# Altium footprint library JL_PCB.PCBLIB: 1129 footprints (part 58 of 72)
Each footprint in its own frame and in the unit in brackets; x right, y up, seen from the top. Pads: shape width x height; smd on the part's side, far side on the other; paste and mask are expansions set on the pad; w line width, h text height; cw(c..) or ccw(c..) is an arc to the next point about the centre after c.
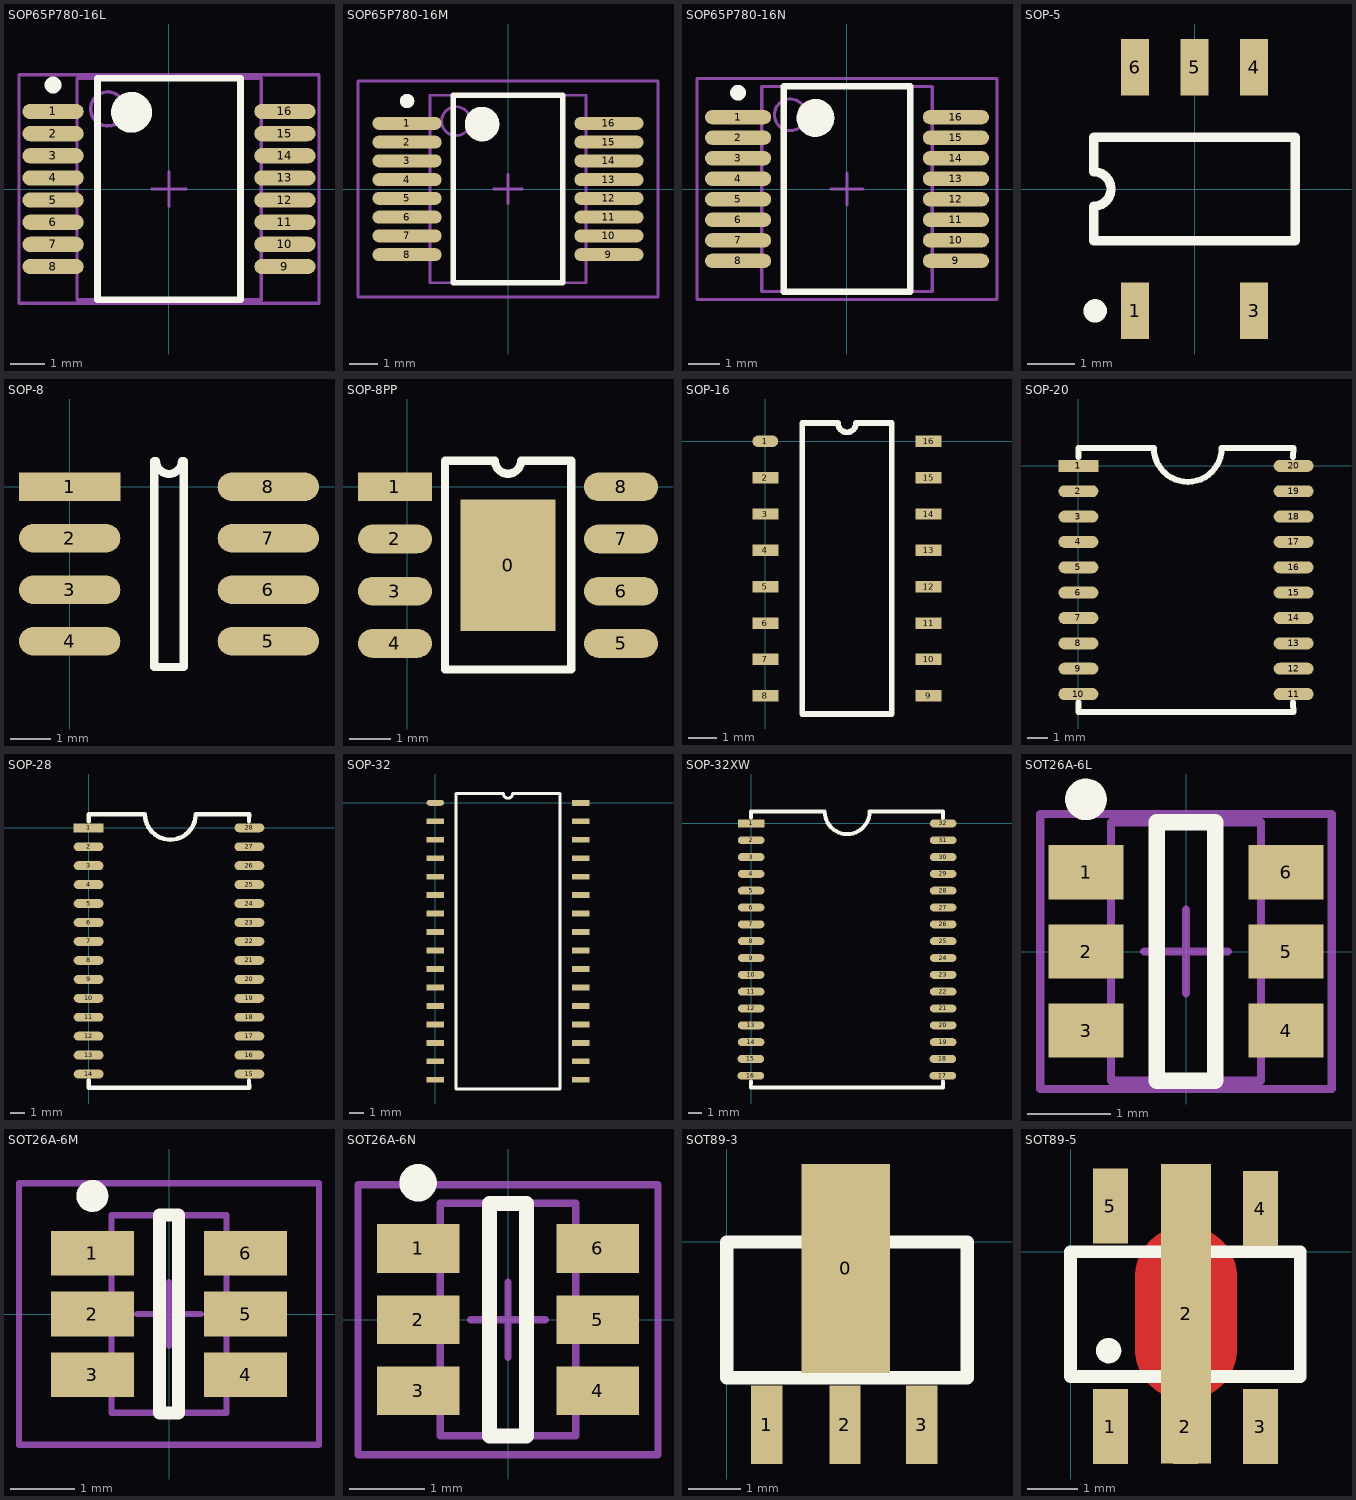
[diagram p57: the footprints below, top view; thin cyan lines are the x and y axes]

## SOP65P780-16L [mm] "SOP, 16-Leads, Body 6.2x5.3mm, Pitch 0.65mm, IPC High Density"
height 2
pads (16):
  oval 1.8x0.45 smd: 1(-3.4,2.275) 2(-3.4,1.625) 3(-3.4,0.975) 4(-3.4,0.325) 5(-3.4,-0.325) 6(-3.4,-0.975) 7(-3.4,-1.625) 8(-3.4,-2.275) 9(3.4,-2.275) 10(3.4,-1.625) 11(3.4,-0.975) 12(3.4,-0.325) 13(3.4,0.325) 14(3.4,0.975) 15(3.4,1.625) 16(3.4,2.275)
TopOverlay:
  circle w0.6: c-1.1,2.25 r0.3
  circle w0.25: c-3.4,3.05 r0.125
  lines w0.2: -2.1,-3.25 2.1,-3.25 2.1,3.25 -2.1,3.25 -2.1,-3.25
Mechanical13:
  circle w0.1: c-1.8,2.35 r0.5
  lines w0.1: -2.7,-3.25 2.7,-3.25 2.7,3.25 -2.7,3.25 -2.7,-3.25
Mechanical15:
  lines w0.1: -0.5,0 0.5,0 ; 0,-0.5 0,0.5 ; -4.4,-3.35 4.4,-3.35 4.4,3.35 -4.4,3.35 -4.4,-3.35
3D body: height 2, standoff 0, extent -2.7,-3.25 2.7,3.25

## SOP65P780-16M [mm] "SOP, 16-Leads, Body 6.2x5.3mm, Pitch 0.65mm, IPC Low Density"
height 2
pads (16):
  oval 2.4x0.45 smd: 1(-3.5,2.275) 2(-3.5,1.625) 3(-3.5,0.975) 4(-3.5,0.325) 5(-3.5,-0.325) 6(-3.5,-0.975) 7(-3.5,-1.625) 8(-3.5,-2.275) 9(3.5,-2.275) 10(3.5,-1.625) 11(3.5,-0.975) 12(3.5,-0.325) 13(3.5,0.325) 14(3.5,0.975) 15(3.5,1.625) 16(3.5,2.275)
TopOverlay:
  circle w0.25: c-3.5,3.05 r0.125
  circle w0.6: c-0.9,2.25 r0.3
  lines w0.2: -1.9,-3.25 -1.9,3.25 1.9,3.25 1.9,-3.25 -1.9,-3.25
Mechanical13:
  circle w0.1: c-1.8,2.35 r0.5
  lines w0.1: -2.7,-3.25 -2.7,3.25 2.7,3.25 2.7,-3.25 -2.7,-3.25
Mechanical15:
  lines w0.1: -0.5,0 0.5,0 ; 0,-0.5 0,0.5 ; -5.2,-3.75 -5.2,3.75 5.2,3.75 5.2,-3.75 -5.2,-3.75
3D body: height 2, standoff 0, extent -2.7,-3.25 2.7,3.25

## SOP65P780-16N [mm] "SOP, 16-Leads, Body 6.2x5.3mm, Pitch 0.65mm, IPC Medium Density"
height 2
pads (16):
  oval 2.1x0.45 smd: 1(-3.45,2.275) 2(-3.45,1.625) 3(-3.45,0.975) 4(-3.45,0.325) 5(-3.45,-0.325) 6(-3.45,-0.975) 7(-3.45,-1.625) 8(-3.45,-2.275) 9(3.45,-2.275) 10(3.45,-1.625) 11(3.45,-0.975) 12(3.45,-0.325) 13(3.45,0.325) 14(3.45,0.975) 15(3.45,1.625) 16(3.45,2.275)
TopOverlay:
  circle w0.6: c-1,2.25 r0.3
  circle w0.25: c-3.45,3.05 r0.125
  lines w0.2: -2,-3.25 2,-3.25 2,3.25 -2,3.25 -2,-3.25
Mechanical13:
  circle w0.1: c-1.8,2.35 r0.5
  lines w0.1: -2.7,-3.25 2.7,-3.25 2.7,3.25 -2.7,3.25 -2.7,-3.25
Mechanical15:
  lines w0.1: -0.5,0 0.5,0 ; 0,-0.5 0,0.5 ; -4.75,-3.5 4.75,-3.5 4.75,3.5 -4.75,3.5 -4.75,-3.5
3D body: height 2, standoff 0, extent -2.7,-3.25 2.7,3.25

## SOP-5 [mm] "Small Outline; 6 Leads (1 Absent); Body Width 4.4 mm; Pitch 1.27 mm"
height 2.4
pads (5):
  rect 0.6x1.2 smd: 1(-1.27,-2.6) 3(1.27,-2.6) 4(1.27,2.6) 5(0,2.6) 6(-1.27,2.6)
TopOverlay:
  circle w0.25: c-2.12,-2.6 r0.125
  lines w0.2: -2.15,-1.1 2.15,-1.1 2.15,1.1 -2.15,1.1 -2.15,0.367 cw(c-2.15,0) -2.15,-0.367 -2.15,-1.1

## SOP-8 [mm]
pads (8):
  rect 2.5x0.7 smd: 1(0,0)
  oval 2.5x0.7 smd: 2(0,-1.27) 3(0,-2.54) 4(0,-3.81) 5(4.9,-3.81) 6(4.9,-2.54) 7(4.9,-1.27) 8(4.9,0)
TopOverlay:
  lines w0.2: 2.085,-4.445 2.085,0.635 2.133,0.635 ccw(c2.45,0.635) 2.768,0.635 2.815,0.635 2.815,-4.445 2.085,-4.445
3D body "User Library-sop-8.step": height 1.6, standoff 0, extent -0.557,-4.436 5.485,0.584

## SOP-8PP [mm]
pads (9):
  rect 2.3x3.2 smd: 0(2.45,-1.905)
  rect 1.8x0.7 smd: 1(-0.3,0)
  oval 1.8x0.7 smd: 2(-0.3,-1.27) 3(-0.3,-2.54) 4(-0.3,-3.81) 5(5.2,-3.81) 6(5.2,-2.54) 7(5.2,-1.27) 8(5.2,0)
TopOverlay:
  lines w0.2: 0.914,-4.445 0.914,0.635 2.133,0.635 ccw(c2.45,0.635) 2.768,0.635 3.988,0.635 3.988,-4.445 0.914,-4.445
3D body "User Library-sop-8.step": height 1.6, standoff 0, extent -0.557,-4.436 5.485,0.584

## SOP-16 [mm]
pads (16):
  oval 0.9x0.4 smd: 1(0,0)
  rect 0.9x0.4 smd: 2(0,-1.27) 3(0,-2.54) 4(0,-3.81) 5(0,-5.08) 6(0,-6.35) 7(0,-7.62) 8(0,-8.89) 9(5.7,-8.89) 10(5.7,-7.62) 11(5.7,-6.35) 12(5.7,-5.08) 13(5.7,-3.81) 14(5.7,-2.54) 15(5.7,-1.27) 16(5.7,0)
TopOverlay:
  lines w0.2: 1.285,-9.525 4.415,-9.525 4.415,0.635 3.167,0.635 cw(c2.85,0.635) 2.532,0.635 1.285,0.635 1.285,-9.525
3D body "SOIC16.STEP": height 1.95, standoff 0, extent -0.127,-9.601 5.929,0.699

## SOP-20 [mm]
pads (20):
  rect 2x0.6 smd: 1(0,0)
  oval 2x0.6 smd: 2(0,-1.27) 3(0,-2.54) 4(0,-3.81) 5(0,-5.08) 6(0,-6.35) 7(0,-7.62) 8(0,-8.89) 9(0,-10.16) 10(0,-11.43) 11(10.776,-11.43) 12(10.776,-10.16) 13(10.776,-8.89) 14(10.776,-7.62) 15(10.776,-6.35) 16(10.776,-5.08) 17(10.776,-3.81) 18(10.776,-2.54) 19(10.776,-1.27) 20(10.776,0)
TopOverlay:
  lines w0.3: 0,-11.85 -0.004,-12.334 10.764,-12.334 10.75,-11.85 ; 0,0.45 -0.004,0.9 3.778,0.9 ccw(c5.478,0.9) 7.178,0.9 10.764,0.9 10.75,0.45

## SOP-28 [mm]
pads (28):
  rect 2x0.6 smd: 1(0,0)
  oval 2x0.6 smd: 2(0,-1.27) 3(0,-2.54) 4(0,-3.81) 5(0,-5.08) 6(0,-6.35) 7(0,-7.62) 8(0,-8.89) 9(0,-10.16) 10(0,-11.43) 11(0,-12.7) 12(0,-13.97) 13(0,-15.24) 14(0,-16.51) 15(10.776,-16.51) 16(10.776,-15.24) 17(10.776,-13.97) 18(10.776,-12.7) 19(10.776,-11.43) 20(10.776,-10.16) 21(10.776,-8.89) 22(10.776,-7.62) 23(10.776,-6.35) 24(10.776,-5.08) 25(10.776,-3.81) 26(10.776,-2.54) 27(10.776,-1.27) 28(10.776,0)
TopOverlay:
  lines w0.3: 0,-16.93 -0.004,-17.414 10.764,-17.414 10.75,-16.93 ; 0,0.45 -0.004,0.9 3.778,0.9 ccw(c5.478,0.9) 7.178,0.9 10.764,0.9 10.75,0.45
3D body "SOP-28.STEP": height 2.52, standoff 0.02, extent 0.143,-17.432 10.643,0.718

## SOP-32 [mm]
pads (32):
  oval 1.2x0.4 smd: 1(0,0)
  rect 1.2x0.4 smd: 2(0,-1.27) 3(0,-2.54) 4(0,-3.81) 5(0,-5.08) 6(0,-6.35) 7(0,-7.62) 8(0,-8.89) 9(0,-10.16) 10(0,-11.43) 11(0,-12.7) 12(0,-13.97) 13(0,-15.24) 14(0,-16.51) 15(0,-17.78) 16(0,-19.05) 17(10,-19.05) 18(10,-17.78) 19(10,-16.51) 20(10,-15.24) 21(10,-13.97) 22(10,-12.7) 23(10,-11.43) 24(10,-10.16) 25(10,-8.89) 26(10,-7.62) 27(10,-6.35) 28(10,-5.08) 29(10,-3.81) 30(10,-2.54) 31(10,-1.27) 32(10,0)
TopOverlay:
  lines w0.2: 1.435,-19.685 1.435,0.635 4.683,0.635 ccw(c5,0.635) 5.318,0.635 8.565,0.635 8.565,-19.685 1.435,-19.685

## SOP-32XW [mm]
pads (32):
  rect 2x0.6 smd: 1(0,0)
  oval 2x0.6 smd: 2(0,-1.27) 3(0,-2.54) 4(0,-3.81) 5(0,-5.08) 6(0,-6.35) 7(0,-7.62) 8(0,-8.89) 9(0,-10.16) 10(0,-11.43) 11(0,-12.7) 12(0,-13.97) 13(0,-15.24) 14(0,-16.51) 15(-0.025,-17.78) 16(-0.025,-19.05) 17(14.475,-19.05) 18(14.475,-17.78) 19(14.5,-16.51) 20(14.5,-15.24) 21(14.5,-13.97) 22(14.5,-12.7) 23(14.5,-11.43) 24(14.5,-10.16) 25(14.5,-8.89) 26(14.5,-7.62) 27(14.5,-6.35) 28(14.5,-5.08) 29(14.5,-3.81) 30(14.5,-2.54) 31(14.5,-1.27) 32(14.5,0)
TopOverlay:
  lines w0.3: -0.025,-19.47 -0.029,-19.954 14.475,-19.954 14.475,-19.47 ; 0,0.45 -0.004,0.9 5.512,0.9 ; 5.55,0.9 ccw(c7.25,0.9) 8.95,0.9 ; 8.937,0.914 14.478,0.914 ; 14.5,0.406 14.5,0.856
3D body "SOP32XW.STEP": height 3.05, standoff 0.02, extent 0.007,-20 14.407,0.95

## SOT26A-6L [mm] "SOT23, 6-Leads, Body 2.9x1.6mm, Pitch 0.95mm, Lead Span 2.7mm, IPC High Density"
height 1.45
pads (6):
  rect 0.9x0.65 smd: 1(-1.2,0.95) 2(-1.2,0) 3(-1.2,-0.95) 4(1.2,-0.95) 5(1.2,0) 6(1.2,0.95)
TopOverlay:
  circle w0.25: c-1.2,1.825 r0.125
  lines w0.2: -0.35,-1.55 0.35,-1.55 0.35,1.55 -0.35,1.55 -0.35,-1.55
Mechanical13:
  lines w0.1: -0.9,-1.55 -0.9,1.55 0.9,1.55 0.9,-1.55 -0.9,-1.55
Mechanical15:
  lines w0.1: -0.5,0 0.5,0 ; 0,-0.5 0,0.5 ; -1.75,-1.65 -1.75,1.65 1.75,1.65 1.75,-1.65 -1.75,-1.65
3D body: height 1.45, standoff 0, extent -0.9,-1.55 0.9,1.55

## SOT26A-6M [mm] "SOT23, 6-Leads, Body 2.9x1.6mm, Pitch 0.95mm, Lead Span 2.7mm, IPC Low Density"
height 1.45
pads (6):
  rect 1.3x0.7 smd: 1(-1.2,0.95) 2(-1.2,0) 3(-1.2,-0.95) 4(1.2,-0.95) 5(1.2,0) 6(1.2,0.95)
TopOverlay:
  circle w0.25: c-1.2,1.85 r0.125
  lines w0.2: -0.15,-1.55 -0.15,1.55 0.15,1.55 0.15,-1.55 -0.15,-1.55
Mechanical13:
  lines w0.1: -0.9,-1.55 0.9,-1.55 0.9,1.55 -0.9,1.55 -0.9,-1.55
Mechanical15:
  lines w0.1: -0.5,0 0.5,0 ; 0,-0.5 0,0.5 ; -2.35,-2.05 2.35,-2.05 2.35,2.05 -2.35,2.05 -2.35,-2.05
3D body: height 1.45, standoff 0, extent -0.9,-1.55 0.9,1.55

## SOT26A-6N [mm] "SOT23, 6-Leads, Body 2.9x1.6mm, Pitch 0.95mm, Lead Span 2.7mm, IPC Medium Density"
height 1.45
pads (6):
  rect 1.1x0.65 smd: 1(-1.2,0.95) 2(-1.2,0) 3(-1.2,-0.95) 4(1.2,-0.95) 5(1.2,0) 6(1.2,0.95)
TopOverlay:
  circle w0.25: c-1.2,1.825 r0.125
  lines w0.2: -0.25,-1.55 0.25,-1.55 0.25,1.55 -0.25,1.55 -0.25,-1.55
Mechanical13:
  lines w0.1: -0.9,-1.55 -0.9,1.55 0.9,1.55 0.9,-1.55 -0.9,-1.55
Mechanical15:
  lines w0.1: -0.5,0 0.5,0 ; 0,-0.5 0,0.5 ; -2,-1.8 -2,1.8 2,1.8 2,-1.8 -2,-1.8
3D body: height 1.45, standoff 0, extent -0.9,-1.55 0.9,1.55

## SOT89-3 [mm]
pads (4):
  rect 1.7x4 smd: 0(2.275,-0.508)
  rect 0.6x1.5 smd: 1(0.762,-3.5) 2(2.261,-3.5) 3(3.734,-3.5)
TopOverlay:
  lines w0.254: 0,-2.6 0,0 4.6,0 4.6,-2.6 0,-2.6
3D body "User Library-SOT89-3.STEP": height 1.56, standoff 0.02, extent 0.011,-3.571 4.511,0.679

## SOT89-5 [mm]
pads (6):
  rect 0.7x1.5 smd: 1(0.8,-3.5) 3(3.8,-3.5) 4(3.8,0.864) 5(0.8,0.914)
  rect 0.5x1.5 smd: 2(2.3,-3.5)
  rect 1x6 smd: 2(2.311,-1.245)
TopLayer:
  lines w2.032: 2.311,-1.956 2.311,-0.5
TopOverlay:
  circle w0.254: c0.762,-1.981 r0.127
  lines w0.254: 0,-2.5 0,0 4.6,0 4.6,-2.5 0,-2.5
3D body "SOT89-5.STEP": height 1.56, standoff 0.02, extent 0.062,-3.494 4.562,1.006